# Altium footprint library ref-packages-longpad.PCBLIB: 1527 footprints (part 94 of 103)
Each footprint in its own frame and in the unit in brackets; x right, y up, seen from the top. Pads: shape width x height; smd on the part's side, far side on the other; paste and mask are expansions set on the pad; w line width, h text height; cw(c..) or ccw(c..) is an arc to the next point about the centre after c.
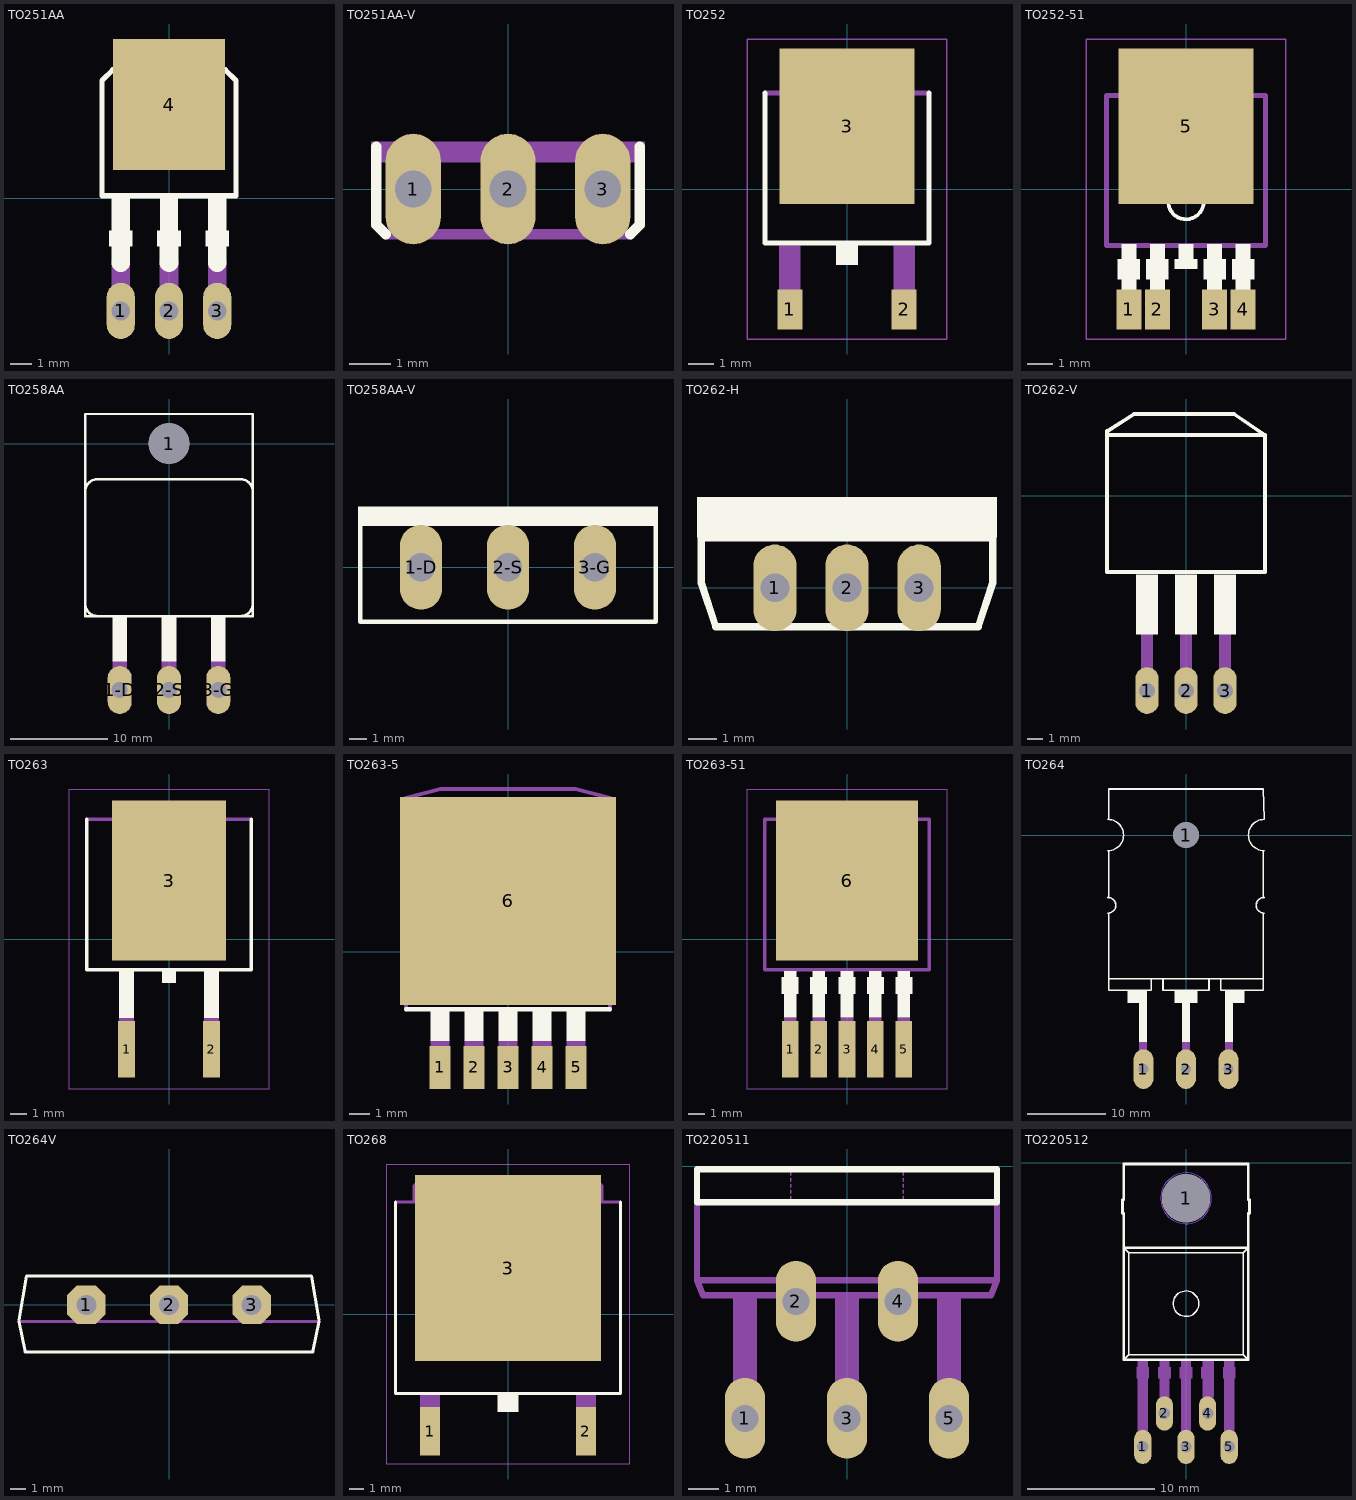
[diagram p93: the footprints below, top view; thin cyan lines are the x and y axes]

## TO251AA [mil]
pads (4):
  oval 52.5x105 hole 35: 1(-90,-210) 2(0,-210) 3(90,-210)
  rect 210x245 smd: 4(0,175)
Top Overlay:
  rectangle: -22,-90 22,-60
  rectangle: -17,-60 17,0
  rectangle: -112,-90 -68,-60
  rectangle: 68,-90 112,-60
  rectangle: -107,-60 -73,0
  rectangle: 73,-60 107,0
  lines w10: -100,240 100,240 ; -100,240 -105,240 -125,220 -125,5 125,5 125,220 105,240 100,240 ; -100,240 -100,270 -65,290 65,290 100,270 100,240
  lines w35: -90,-120 -90,-90 ; 0,-120 0,-90 ; 90,-120 90,-90
Mechanical 16:
  lines w35: -90,-210 -90,-120 ; 0,-210 0,-120 ; 90,-210 90,-120

## TO251AA-V [mil]
pads (3):
  oval 52.5x105 hole 35: 1(-90,0) 2(0,0) 3(90,0)
Top Overlay:
  lines w10: -125,40 -125,-34 -116,-43 ; 116,-43 125,-34 125,40
Mechanical 16:
  rectangle: -130,25 130,45
  lines w10: -115,-43 -100,-43 ; -100,23 -100,-43 ; 100,23 100,-43 ; 116,-43 100,-43 ; -100,-43 100,-43

## TO252 [mm]
pads (3):
  rect 1x1.6 smd: 1(-2.28,-4.8) 2(2.28,-4.8)
  rect 5.4x6.2 smd: 3(0,2.5)
Top Overlay:
  rectangle: -0.432,-3.023 0.432,-2.261
  lines w0.203: -3.277,3.835 -3.277,-2.159 3.277,-2.159 3.277,3.835
Mechanical 16:
  rectangle: -2.718,-5.156 -1.854,-2.261
  rectangle: 1.854,-5.156 2.718,-2.261
  region: 0,0 0.254,0 0.254,0.254 0,0.254
  lines w0.203: -3.277,3.835 3.277,3.835 ; -2.565,3.937 -2.565,4.648 -2.108,5.105 2.108,5.105 2.565,4.648 2.565,3.937 -2.565,3.937
Mechanical 27:
  lines w0.051: -3.973,-5.983 3.973,-5.983 3.973,5.983 -3.973,5.983 -3.973,-5.983

## TO252-51 [mm]
pads (5):
  rect 1x1.6 smd: 1(-2.28,-4.8) 2(-1.14,-4.8) 3(1.14,-4.8) 4(2.28,-4.8)
  rect 5.4x6.2 smd: 5(0,2.5)
Top Overlay:
  circle w0.152: c0,-0.5 r0.707
  rectangle: -0.3,-3.2 0.3,-2.2
  rectangle: -2.58,-5.05 -1.98,-2.2
  rectangle: -1.44,-5.05 -0.84,-2.2
  rectangle: 0.84,-5.05 1.44,-2.2
  rectangle: 1.98,-5.05 2.58,-2.2
  rectangle: -2.73,-3.6 -1.83,-2.8
  rectangle: -1.59,-3.6 -0.69,-2.8
  rectangle: 0.69,-3.6 1.59,-2.8
  rectangle: 1.83,-3.6 2.73,-2.8
  rectangle: -0.45,-3.2 0.45,-2.8
  region: 0,0 0.254,0 0.254,0.254 0,0.254
Mechanical 16:
  lines w0.203: -3.177,-2.26 -3.177,3.735 3.177,3.735 3.177,-2.259 -3.178,-2.259
Mechanical 27:
  lines w0.051: -3.973,-5.983 3.973,-5.983 3.973,5.983 -3.973,5.983 -3.973,-5.983

## TO258AA [mil]
pads (4):
  round 165 hole 165: 1(0,0)
  oval 97.5x195 hole 65: 1-D(-200,-1000) 2-S(0,-1000) 3-G(200,-1000)
Top Overlay:
  rectangle: -230,-885 -170,-700
  rectangle: -30,-885 30,-700
  rectangle: 170,-885 230,-700
  lines w10: -340,-650 -340,-195 ; -340,-650 -340,-700 -290,-700 ; -340,-650 ccw(c-290,-650) -290,-700 ; -340,-195 -340,120 340,120 340,-195 ; -340,-195 cw(c-290,-195) -290,-145 290,-145 cw(c290,-195) 340,-195 ; -290,-700 290,-700 ; 290,-700 340,-700 340,-650 ; 290,-700 ccw(c290,-650) 340,-650 ; 340,-650 340,-195
Mechanical 16:
  rectangle: -230,-1010 -170,-880
  rectangle: -30,-1010 30,-880
  rectangle: 170,-1010 230,-880

## TO258AA-V [mil]
pads (3):
  oval 97.5x195 hole 65: 1-D(-200,0) 2-S(0,0) 3-G(200,0)
Top Overlay:
  rectangle: -345,95 345,140
  lines w10: -340,-125 -340,120 340,120 340,-125 -340,-125

## TO262-H [mil]
pads (3):
  oval 60x120 hole 40: 1(-100,0) 2(0,0) 3(100,0)
Top Overlay:
  rectangle: -208,70 208,126
  lines w10: -202,6 -202,69 202,69 202,6 182,-54 -182,-54 -202,6

## TO262-V [mil]
pads (3):
  oval 60x120 hole 40: 1(-100,-500) 2(0,-500) 3(100,-500)
Top Overlay:
  rectangle: -128,-356 -72,-300
  rectangle: -128,-300 -72,-202
  rectangle: 72,-300 128,-202
  rectangle: -28,-300 28,-202
  rectangle: -28,-356 28,-300
  rectangle: 72,-356 128,-300
  lines w10: -202,155 -202,165 -133,209 123,209 202,155 ; -202,155 -202,-196 202,-196 202,155 ; -202,155 202,155
Mechanical 16:
  rectangle: -115,-510 -85,-355
  rectangle: -15,-510 15,-355
  rectangle: 85,-510 115,-355

## TO263 [mm]
pads (3):
  rect 1x3.4 smd: 1(-2.54,-6.6) 2(2.54,-6.6)
  rect 6.8x9.6 smd: 3(0,3.5)
Top Overlay:
  rectangle: -0.432,-2.643 0.432,-1.881
  rectangle: -2.99,-4.74 -2.09,-1.94
  rectangle: 2.09,-4.74 2.99,-1.94
  lines w0.203: -4.917,7.165 -4.917,-1.839 4.917,-1.839 4.917,7.165
Mechanical 16:
  rectangle: -3,-7.5 -2.1,-4.7
  rectangle: 2.1,-7.5 3,-4.7
  region: 0,0 0.254,0 0.254,0.254 0,0.254
  lines w0.203: -4.917,7.165 4.917,7.165 ; -2.565,7.267 -2.565,7.678 -2.108,8.135 2.108,8.135 2.565,7.678 2.565,7.267 -2.565,7.267
Mechanical 27:
  lines w0.051: -5.973,-8.983 5.973,-8.983 5.973,8.983 -5.973,8.983 -5.973,-8.983

## TO263-5 [mil]
pads (6):
  rect 42x85 smd: 1(-134,-228) 2(-67,-228) 3(0,-228) 4(67,-228) 5(134,-228)
  rect 425.2x409.84 smd: 6(0,100)
Top Overlay:
  rectangle: -153,-176 -115,-110
  rectangle: -86,-176 -48,-110
  rectangle: -19,-176 19,-110
  rectangle: 48,-176 86,-110
  rectangle: 115,-176 153,-110
  lines w8: -200.55,-113.39 200.55,-113.39
Mechanical 16:
  rectangle: -153,-260 -115,-175
  rectangle: -86,-260 -48,-175
  rectangle: -19,-260 19,-175
  rectangle: 48,-260 86,-175
  rectangle: 115,-260 153,-175
  region: 0,0 10,0 10,10 0,10
  lines w8: -200.55,-113.39 -200.55,282.09 200.55,282.09 200.55,-113.39 ; -200.98,286.1 -200.98,302.28 -132.99,320.28 132.99,320.28 200.98,302.28 200.98,286.1 -200.98,286.1

## TO263-51 [mm]
pads (6):
  rect 1x3.4 smd: 1(-3.4,-6.6) 2(-1.7,-6.6) 3(0,-6.6) 4(1.7,-6.6) 5(3.4,-6.6)
  rect 8.5x9.6 smd: 6(0,3.5)
Top Overlay:
  rectangle: -0.381,-4.699 0.381,-1.905
  rectangle: -0.508,-3.302 0.508,-2.286
  rectangle: -3.781,-4.699 -3.019,-1.905
  rectangle: -2.081,-4.699 -1.319,-1.905
  rectangle: 1.319,-4.699 2.081,-1.905
  rectangle: 3.019,-4.699 3.781,-1.905
  rectangle: -3.908,-3.302 -2.892,-2.286
  rectangle: -2.208,-3.302 -1.192,-2.286
  rectangle: 1.192,-3.302 2.208,-2.286
  rectangle: 2.892,-3.302 3.908,-2.286
Mechanical 16:
  circle w0.254: c0,3 r1
  rectangle: -0.381,-7.493 0.381,-4.699
  rectangle: -3.781,-7.493 -3.019,-4.699
  rectangle: -2.081,-7.493 -1.319,-4.699
  rectangle: 1.319,-7.493 2.081,-4.699
  rectangle: 3.019,-7.493 3.781,-4.699
  region: 0,0 0.254,0 0.254,0.254 0,0.254
  lines w0.203: -4.917,-1.839 4.917,-1.839 4.917,7.165 -4.917,7.165 -4.917,-1.839
Mechanical 27:
  lines w0.051: -5.973,-8.983 5.973,-8.983 5.973,8.983 -5.973,8.983 -5.973,-8.983

## TO264 [mil]
pads (4):
  oval 100x200 hole 51.18: 1(-214.57,-1181.1) 2(0,-1181.1) 3(214.57,-1181.1)
  round 129.92 hole 129.92: 1(0,0)
Top Overlay:
  rectangle: -236.22,-1043.31 -196.85,-787.4
  rectangle: -19.69,-1043.31 19.69,-787.4
  rectangle: 196.85,-1043.31 236.22,-787.4
  rectangle: -295.28,-846.46 -236.22,-787.4
  rectangle: -59.06,-846.46 59.06,-787.4
  rectangle: 236.22,-846.46 295.28,-787.4
  lines w7.87: -393.7,-393.7 ccw(c-393.7,-354.33) -393.7,-314.96 ; -393.7,-78.74 ccw(c-393.7,0) -393.7,78.74 ; -389.76,-393.7 -389.76,-724.41 ; -389.76,-314.96 -389.76,-78.74 ; -389.76,78.74 -389.76,232.28 389.76,232.28 393.7,78.74 ccw(c393.7,0) 393.7,-78.74 ; 389.76,-393.7 389.76,-724.41 ; 389.76,-314.96 389.76,-78.74 ; 393.7,-393.7 cw(c393.7,-354.33) 393.7,-314.96 ; -389.76,-724.41 -389.76,-783.46 -175.2,-783.46 -175.2,-724.41 ; -389.76,-724.41 -175.2,-724.41 ; -175.2,-724.41 -116.14,-724.41 ; -116.14,-724.41 -116.14,-783.46 116.14,-783.46 116.14,-724.41 ; -116.14,-724.41 116.14,-724.41 ; 116.14,-724.41 175.2,-724.41 ; 175.2,-724.41 175.2,-783.46 389.76,-783.46 389.76,-724.41 ; 175.2,-724.41 389.76,-724.41
Mechanical 16:
  rectangle: -236.22,-1181.1 -196.85,-1043.31
  rectangle: -19.69,-1181.1 19.69,-1043.31
  rectangle: 196.85,-1181.1 236.22,-1043.31
Via Holes:
  rectangle: -275.59,-551.18 275.59,-118.11

## TO264V [mil]
pads (3):
  oct 100x100 hole 51.18: 1(-214.57,0) 2(0,0) 3(214.57,0)
Top Overlay:
  lines w7.87: -389.76,-43.31 -374.02,-118.11 -374.02,-122.05 374.02,-122.05 374.02,-118.11 389.76,-43.31 ; -389.76,-39.37 -370.08,74.8 370.08,74.8 389.76,-39.37
Mechanical 16:
  lines w7.87: -389.76,-43.31 389.76,-43.31

## TO268 [mil]
pads (3):
  rect 55.12x133.86 smd: 1(-214.57,-322.83) 2(214.57,-322.83)
  rect 511.81x511.81 smd: 3(0,125.98)
Top Overlay:
  rectangle: -28.35,-269.69 28.35,-218.5
  lines w8: -309.33,308.46 -309.33,-218.46 309.33,-218.46 309.33,308.46
Top Solder:
  rectangle: -275.59,-145.67 275.59,397.64
Mechanical 16:
  rectangle: -242.13,-375.98 -187.01,-269.69
  rectangle: -242.13,-269.69 -187.01,-218.5
  rectangle: 187.01,-269.69 242.13,-218.5
  rectangle: 187.01,-375.98 242.13,-269.69
  region: 0,0 10,0 10,10 0,10
  lines w8: -309.37,308.46 309.37,308.46 ; -258.48,312.48 -258.48,353.48 -240.48,371.48 240.47,371.5 258.46,353.46 258.46,312.48 -258.48,312.48
Mechanical 27:
  lines w2: -333.58,-412.72 333.58,-412.72 333.58,412.72 -333.58,412.72 -333.58,-412.72

## TO220511 [mil]
pads (5):
  oval 53.15x106.29 hole 35.43: 1(-133.86,-330.71) 2(-66.93,-177.17) 3(0,-330.71) 4(66.93,-177.17) 5(133.86,-330.71)
Top Overlay:
  lines w8: -196.85,-47.24 -196.85,-3.94 196.85,-3.94 196.85,-47.24 -196.85,-47.24
Mechanical 16:
  rectangle: -149.61,-334.65 -118.11,-291.34
  rectangle: -15.75,-334.65 15.75,-291.34
  rectangle: 118.11,-334.65 149.61,-291.34
  rectangle: -149.61,-291.34 -118.11,-173.23
  rectangle: -15.75,-291.34 15.75,-173.23
  rectangle: 118.11,-291.34 149.61,-173.23
  rectangle: -82.68,-181.1 -51.18,-173.23
  rectangle: 51.18,-181.1 82.68,-173.23
  lines w2: -73.62,-46.06 -73.62,-39.37 ; -73.62,-35.43 -73.62,-31.5 ; -73.62,-27.56 -73.62,-23.62 ; -73.62,-19.69 -73.62,-15.75 ; -73.62,-11.81 -73.62,-7.87 ; 73.62,-46.06 73.62,-39.37 ; 73.62,-35.43 73.62,-31.5 ; 73.62,-27.56 73.62,-23.62 ; 73.62,-19.69 73.62,-15.75 ; 73.62,-11.81 73.62,-7.87
  lines w8: -196.85,-47.24 -196.85,-149.61 ; 196.85,-47.24 196.85,-149.61 ; -196.85,-149.61 -188.98,-169.29 188.98,-169.29 196.85,-149.61 ; -196.85,-149.61 196.85,-149.61

## TO220512 [mil]
pads (6):
  oval 53.15x106.29 hole 35.43: 1(-133.86,-880.71) 2(-66.93,-777.17) 3(0,-880.71) 4(66.93,-777.17) 5(133.86,-880.71)
  round 149.61 hole 149.61: 1(0,-110.24)
Top Layer keep-out:
  circle w0: c0,-110.24 r78.74
Bottom Layer keep-out:
  circle w0: c0,-110.24 r78.74
Top Overlay:
  circle w4: c0,-437.01 r39.56
  lines w4: -192.91,-610.24 -177.17,-594.49 ; -188.98,-267.72 -177.17,-279.53 ; 188.98,-267.72 177.17,-279.53 ; 192.91,-610.24 177.17,-594.49 ; -177.17,-594.49 177.17,-594.49 ; -177.17,-594.49 -177.17,-279.53 ; -177.17,-279.53 177.17,-279.53 ; 177.17,-594.49 177.17,-279.53
  lines w8: -196.85,-157.48 -196.85,-114.17 ; -192.91,-157.48 -192.91,-263.78 ; -192.91,-114.17 -192.91,-3.94 192.91,-3.94 192.91,-114.17 ; 192.91,-157.48 192.91,-263.78 ; 196.85,-157.48 196.85,-114.17 ; -192.91,-263.78 -192.91,-610.24 192.91,-610.24 192.91,-263.78 ; -192.91,-263.78 192.91,-263.78
Mechanical 16:
  rectangle: -149.61,-876.77 -118.11,-829.53
  rectangle: -82.68,-774.41 -51.18,-727.17
  rectangle: -15.75,-876.77 15.75,-829.53
  rectangle: 51.18,-774.41 82.68,-727.17
  rectangle: 118.11,-876.77 149.61,-829.53
  rectangle: -153.54,-669.29 -114.17,-633.86
  rectangle: -86.61,-669.29 -47.24,-633.86
  rectangle: -19.69,-669.29 19.69,-633.86
  rectangle: 47.24,-669.29 86.61,-633.86
  rectangle: 114.17,-669.29 153.54,-633.86
  rectangle: -149.61,-830.71 -118.11,-614.17
  rectangle: -82.68,-728.35 -51.18,-614.17
  rectangle: -15.75,-830.71 15.75,-614.17
  rectangle: 51.18,-728.35 86.61,-614.17
  rectangle: 118.11,-830.71 149.61,-614.17
Via Holes:
  circle w0: c0,-110.24 r106.3